# Altium footprint library THU VIEN V1.PcbLib: 400 footprints (part 2 of 25)
Each footprint in its own frame and in the unit in brackets; x right, y up, seen from the top. Pads: shape width x height; smd on the part's side, far side on the other; paste and mask are expansions set on the pad; w line width, h text height; cw(c..) or ccw(c..) is an arc to the next point about the centre after c.
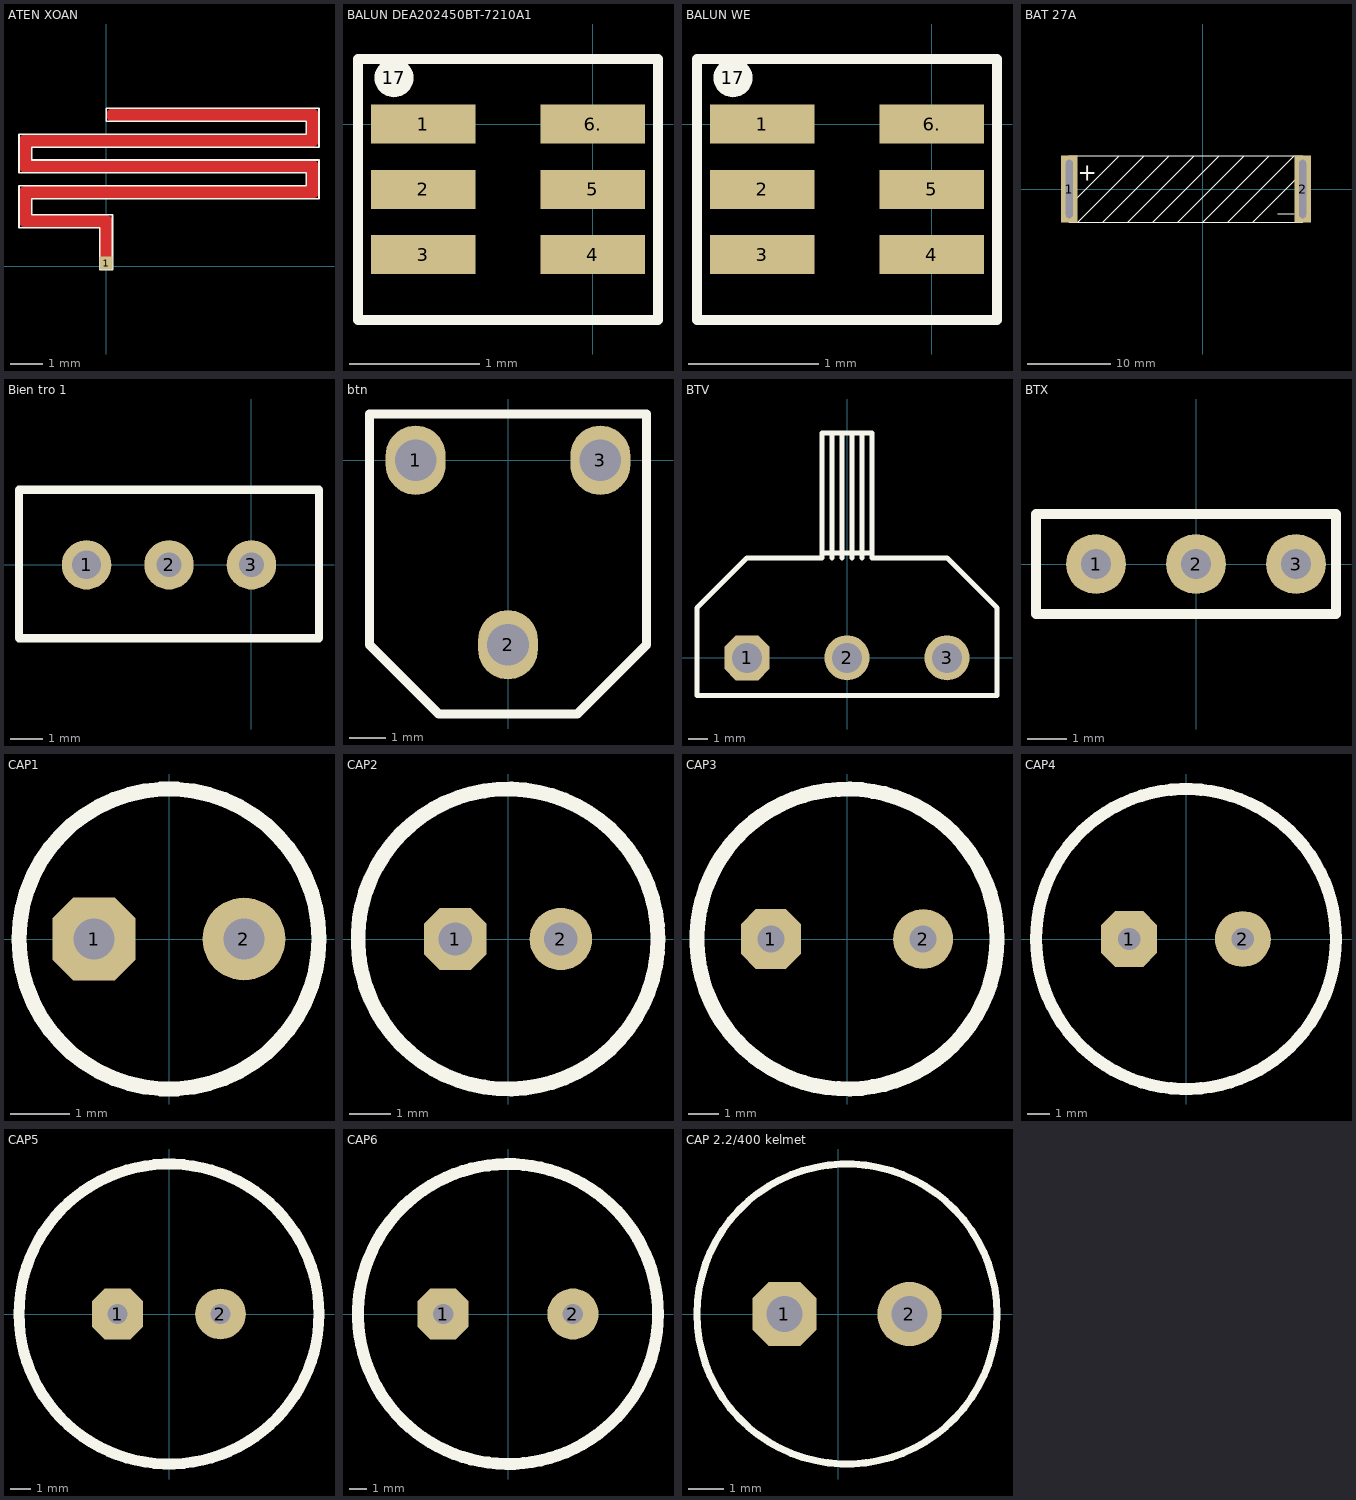
[diagram p1: the footprints below, top view; thin cyan lines are the x and y axes]

## ATEN XOAN [mm]
pads (1):
  rect 0.4x0.4 smd: 1(0,0.1)
Top Layer:
  lines w0.4: 0,0.1 0,1.4 -2.5,1.4 -2.5,2.3 6.4,2.3 6.4,3.1 -2.5,3.1 -2.5,3.9 6.4,3.9 6.4,4.7 0.2,4.7
Top Overlay:
  lines w0.05: -2.7,1.2 -0.2,1.2 -0.2,-0.1 0.2,-0.1 0.2,1.6 0,1.6 -2.3,1.6 -2.3,2.1 6.6,2.1 6.6,3.1 6.6,3.3 -2.3,3.3 -2.3,3.7 6.2,3.7 6.6,3.7 6.6,4.9 0,4.9 0,4.5 1.4,4.5 6.2,4.5 6.2,4.1 -2.7,4.1 -2.7,3.9 -2.7,2.9 6.2,2.9 6.2,2.5 0.5,2.5 -2.7,2.5 -2.7,1.2

## BALUN DEA202450BT-7210A1 [mm]
pads (7):
  rect 0.8x0.3 smd: 1(-1.3,0) 2(-1.3,-0.5) 3(-1.3,-1) 4(0,-1) 5(0,-0.5) 6.(0,0)
  round 0.3 on Top Overlay: 17(-1.524,0.356)
Top Overlay:
  lines w0.076: -1.8,-1.5 0.5,-1.5 0.5,0.5 -1.8,0.5 -1.8,-1.5
3D body: height -0.42, standoff -1.22, extent -1.285,-1.508 -0.036,0.492

## BALUN TDK [mm]

## BALUN WE [mm]
pads (7):
  rect 0.8x0.3 smd: 1(-1.3,0) 2(-1.3,-0.5) 3(-1.3,-1) 4(0,-1) 5(0,-0.5) 6.(0,0)
  round 0.3 on Top Overlay: 17(-1.524,0.356)
Top Overlay:
  lines w0.076: -1.8,-1.5 0.5,-1.5 0.5,0.5 -1.8,0.5 -1.8,-1.5
3D body: height -0.42, standoff -1.22, extent -1.285,-1.508 -0.036,0.492

## BAT 27A [mm]
pads (2):
  rect 2x8 hole 0.8 slot 7 at 90 deg: 1(-16,0) 2(12,0)
Top Overlay:
  lines w0.1: -16,-2 -10,4 ; 6,-4 12,2 ; 9,-3 11,-3 ; -15,-4 -16,-4 -16,4 -15,4 12,4 12,-4 -15,-4 ; -15,-4 -7,4 -4,4 -12,-4 -9,-4 -1,4 2,4 -6,-4 ; -6,-4 -6,-4 ; -6,-4 -3,-4 5,4 8,4 0,-4 3,-4 11,4 ; 11,4 11,4 ; 12,2 12,2
  text "+" at -15,1 h2
3D body: height 7.54, standoff 0.06, extent -13.914,-3.61 12.086,3.861
3D body: height 5.25, standoff 2.25, extent -15.894,-1.494 -13.894,1.494

## Bien tro 1 [mil]
pads (3):
  round 60 hole 35: 1(-200,0)
  round 60 hole 30: 2(-100,0) 3(0,0)
Top Overlay:
  lines w10: -282,-89 -282,91 82,91 82,-89 -282,-89
3D body: height 554.25, standoff -134.73, extent -281.1,-93 81.1,95.98

## btn [mil]
pads (3):
  oval 65x75 hole 45: 1(-100,0) 2(0,-200) 3(100,0)
Top Overlay:
  lines w10: -150,-200 -75,-275 75,-275 150,-200 150,50 -150,50 -150,-200

## BTV [mil]
pads (3):
  oct 90x90 hole 60: 1(-200,0)
  round 90 hole 60: 2(0,0) 3(200,0)
Top Overlay:
  lines w10: -50,210 50,210 ; -30,200 -30,450 ; -10,200 -10,450 ; 10,200 10,450 ; 30,200 30,450 ; -300,-75 300,-75 300,100 200,200 50,200 50,450 -50,450 -50,200 -200,200 -300,100 -300,-75

## BTX [mil]
pads (3):
  round 60 hole 30: 1(-100,0) 2(0,0) 3(100,0)
Top Overlay:
  lines w10: -160,-50 -160,50 140,50 140,-50 -160,-50

## CAP1 [mm]
pads (2):
  oct 1.4x1.4 hole 0.7: 1(-1.27,0)
  round 1.4 hole 0.7: 2(1.27,0)
Top Overlay:
  circle w0.254: c0,0 r2.54

## CAP2 [mm]
pads (2):
  oct 1.5x1.5 hole 0.8: 1(-1.27,0)
  round 1.5 hole 0.8: 2(1.27,0)
Top Overlay:
  circle w0.354: c0,0 r3.6

## CAP3 [mm]
pads (2):
  oct 2x2 hole 0.9: 1(-2.54,0)
  round 2 hole 0.9: 2(2.54,0)
Top Overlay:
  circle w0.5: c0,0 r5
3D body: height 20.61, standoff -2.49, extent -6.301,-6.199 6.199,6.301

## CAP4 [mm]
pads (2):
  oct 2.5x2.5 hole 1: 1(-2.54,0)
  round 2.5 hole 1: 2(2.54,0)
Top Overlay:
  circle w0.54: c0,0 r6.7

## CAP5 [mm]
pads (2):
  oct 2.5x2.5 hole 1: 1(-2.54,0)
  round 2.5 hole 1: 2(2.54,0)
Top Overlay:
  circle w0.54: c0,0 r7.4

## CAP6 [mm]
pads (2):
  oct 3x3 hole 1.2: 1(-3.81,0)
  round 3 hole 1.2: 2(3.81,0)
Top Overlay:
  circle w0.7: c0,0 r8.8

## CAP 2.2/400 kelmet [mm]
pads (2):
  oct 1.8x1.8 hole 1: 1(-1.5,0)
  round 1.8 hole 1: 2(2,0)
Top Overlay:
  circle w0.2: c0.25,0 r4.2
3D body: height 12.13, standoff -2.37, extent -3.746,-4 4.254,4